# Altium schematic symbol library Diodes - TVS.SchLib: 5379 symbols (part 5 of 35) (continued)
## 824501511 (continued)
TVS DIODE 51V 82.4V DO214AC; Manufacturer: Würth Elektronik; Bidirectional Channels: 1; Current - Peak Pulse (10/1000µs): 4.9A; Power Line Protection: No; Power - Peak Pulse: 400W; Type: Zener; Voltage - Breakdown (Min): 59.7V (Typ); Voltage - Reverse Standoff (Typ): 51V (Max); Part Number: 824501511; Applications: General Purpose; ComponentLink1Description: Datasheet; ComponentLink1URL: https://katalog.we-online.de/pbs/datasheet/824501511.pdf; ComponentLink2Description: DigiKey Link; ComponentLink2URL: http://digikey.com/product-detail/en/w-rth-elektronik/824501511/732-9963-1-ND/5871116; LastUpdated: 9/2/2020 1:27:53 AM; Lifecycle Status: Active; Minimum Order: 1; Mounting Type: Surface Mount; Operating Temperature: -65°C ~ 150°C (TJ); Package / Case: DO-214AC, SMA; Packaging: TapeAndReel; PartId: 7630; Part Status: Active; Price: 0.17; Series: WE-TVSP; Supplier 1: DigiKey; Supplier Part Number 1: 732-9963-1-ND; Supplier Device Package: DO-214AC; Voltage - Clamping (Max) @ Ipp: 82.4V
footprint DO214AC SMA
pins: 1, 2

## 824501541
designator D?
TVS DIODE 54V 87.1V DO214AC; Manufacturer: Würth Elektronik; Bidirectional Channels: 1; Current - Peak Pulse (10/1000µs): 4.6A; Power Line Protection: No; Power - Peak Pulse: 400W; Type: Zener; Voltage - Breakdown (Min): 63.15V (Typ); Voltage - Reverse Standoff (Typ): 54V (Max); Part Number: 824501541; Applications: General Purpose; ComponentLink1Description: Datasheet; ComponentLink1URL: https://katalog.we-online.de/pbs/datasheet/824501541.pdf; ComponentLink2Description: DigiKey Link; ComponentLink2URL: http://digikey.com/product-detail/en/w-rth-elektronik/824501541/732-9964-1-ND/5871117; LastUpdated: 9/2/2020 1:27:53 AM; Lifecycle Status: Active; Minimum Order: 1; Mounting Type: Surface Mount; Operating Temperature: -65°C ~ 150°C (TJ); Package / Case: DO-214AC, SMA; Packaging: TapeAndReel; PartId: 7633; Part Status: Active; Price: 0.17; Series: WE-TVSP; Supplier 1: DigiKey; Supplier Part Number 1: 732-9964-1-ND; Supplier Device Package: DO-214AC; Voltage - Clamping (Max) @ Ipp: 87.1V
footprint DO214AC SMA
pins: 1, 2

## 824520101
designator D?
TVS DIODE 10V 17V DO214AA; Manufacturer: Würth Elektronik; Current - Peak Pulse (10/1000µs): 35.3A; Power Line Protection: No; Power - Peak Pulse: 600W; Type: Zener; Unidirectional Channels: 1; Voltage - Breakdown (Min): 11.7V (Typ); Voltage - Reverse Standoff (Typ): 10V (Max); Part Number: 824520101; Applications: General Purpose; ComponentLink1Description: Datasheet; ComponentLink1URL: https://katalog.we-online.de/pbs/datasheet/824520101.pdf; ComponentLink2Description: DigiKey Link; ComponentLink2URL: http://digikey.com/product-detail/en/w-rth-elektronik/824520101/732-9772-1-ND/5870926; LastUpdated: 9/2/2020 1:19:49 AM; Lifecycle Status: Active; Minimum Order: 0; Mounting Type: Surface Mount; Operating Temperature: -65°C ~ 150°C (TJ); Package / Case: DO-214AA, SMB; Packaging: TapeAndReel; PartId: 11157; Part Status: Active; Price: 0.24; Series: WE-TVSP; Supplier 1: DigiKey; Supplier Part Number 1: 732-9772-1-ND; Supplier Device Package: DO-214AA; Voltage - Clamping (Max) @ Ipp: 17V
footprint DO214AA SMB
pins: 1, 2

## 824520121
designator D?
TVS DIODE 12V 19.9V DO214AA; Manufacturer: Würth Elektronik; Current - Peak Pulse (10/1000µs): 30.2A; Power Line Protection: No; Power - Peak Pulse: 600W; Type: Zener; Unidirectional Channels: 1; Voltage - Breakdown (Min): 14V (Typ); Voltage - Reverse Standoff (Typ): 12V (Max); Part Number: 824520121; Applications: General Purpose; ComponentLink1Description: Datasheet; ComponentLink1URL: https://katalog.we-online.de/pbs/datasheet/824520121.pdf; ComponentLink2Description: DigiKey Link; ComponentLink2URL: http://digikey.com/product-detail/en/w-rth-elektronik/824520121/732-9774-1-ND/5870928; LastUpdated: 9/2/2020 1:19:51 AM; Lifecycle Status: Active; Minimum Order: 1; Mounting Type: Surface Mount; Operating Temperature: -65°C ~ 150°C (TJ); Package / Case: DO-214AA, SMB; Packaging: TapeAndReel; PartId: 11325; Part Status: Active; Price: 0.24; Series: WE-TVSP; Supplier 1: DigiKey; Supplier Part Number 1: 732-9774-1-ND; Supplier Device Package: DO-214AA; Voltage - Clamping (Max) @ Ipp: 19.9V
footprint DO214AA SMB
pins: 1, 2

## 824520301
designator D?
TVS DIODE 30V 48.4V DO214AA; Manufacturer: Würth Elektronik; Current - Peak Pulse (10/1000µs): 12.4A; Power Line Protection: No; Power - Peak Pulse: 600W; Type: Zener; Unidirectional Channels: 1; Voltage - Breakdown (Min): 35.05V (Typ); Voltage - Reverse Standoff (Typ): 30V (Max); Part Number: 824520301; Applications: General Purpose; ComponentLink1Description: Datasheet; ComponentLink1URL: https://katalog.we-online.de/pbs/datasheet/824520301.pdf; ComponentLink2Description: DigiKey Link; ComponentLink2URL: http://digikey.com/product-detail/en/w-rth-elektronik/824520301/732-9782-1-ND/5870936; LastUpdated: 9/2/2020 1:19:49 AM; Lifecycle Status: Active; Minimum Order: 1; Mounting Type: Surface Mount; Operating Temperature: -65°C ~ 150°C (TJ); Package / Case: DO-214AA, SMB; Packaging: TapeAndReel; PartId: 11151; Part Status: Active; Price: 0.24; Series: WE-TVSP; Supplier 1: DigiKey; Supplier Part Number 1: 732-9782-1-ND; Supplier Device Package: DO-214AA; Voltage - Clamping (Max) @ Ipp: 48.4V
footprint DO214AA SMB
pins: 1, 2

## 824520302
designator D?
WE-TVSP POWER TVS DIODE; Manufacturer: Würth Elektronik; Current - Peak Pulse (10/1000µs): 100A; Power Line Protection: No; Type: Zener; Unidirectional Channels: 1; Voltage - Breakdown (Min): 353V; Voltage - Clamping (Max) @ Ipp: 486V; Voltage - Reverse Standoff (Typ): 300V (Max); Part Number: 824520302; Applications: General Purpose; ComponentLink2Description: DigiKey Link; ComponentLink2URL: http://digikey.com/product-detail/en/würth-elektronik/824520302/732-824520302CT-ND/12728095; LastUpdated: 8/30/2020 9:00:52 PM; Lifecycle Status: Active; Minimum Order: 1; Mounting Type: Surface Mount; Operating Temperature: -65°C ~ 150°C (TA); Package / Case: DO-214AA, SMB; Packaging: TapeAndReel; PartId: 11468; Price: 0.54; Series: WE-TVSP; Supplier 1: DigiKey; Supplier Part Number 1: 732-824520302CT-ND; Supplier Device Package: DO-214AA
footprint DO214AA SMB
pins: 1, 2

## 824520331
designator D?
TVS DIODE 33V 53.3V DO214AA; Manufacturer: Würth Elektronik; Current - Peak Pulse (10/1000µs): 11.3A; Power Line Protection: No; Power - Peak Pulse: 600W; Type: Zener; Unidirectional Channels: 1; Voltage - Breakdown (Min): 38.65V (Typ); Voltage - Reverse Standoff (Typ): 33V (Max); Part Number: 824520331; Applications: General Purpose; ComponentLink1Description: Datasheet; ComponentLink1URL: https://katalog.we-online.de/pbs/datasheet/824520331.pdf; ComponentLink2Description: DigiKey Link; ComponentLink2URL: http://digikey.com/product-detail/en/w-rth-elektronik/824520331/732-9783-1-ND/5870937; LastUpdated: 9/2/2020 1:19:49 AM; Lifecycle Status: Active; Minimum Order: 1; Mounting Type: Surface Mount; Operating Temperature: -65°C ~ 150°C (TJ); Package / Case: DO-214AA, SMB; Packaging: TapeAndReel; PartId: 11149; Part Status: Active; Price: 0.24; Series: WE-TVSP; Supplier 1: DigiKey; Supplier Part Number 1: 732-9783-1-ND; Supplier Device Package: DO-214AA; Voltage - Clamping (Max) @ Ipp: 53.3V
footprint DO214AA SMB
pins: 1, 2

## 824520352
designator D?
WE-TVSP POWER TVS DIODE; Manufacturer: Würth Elektronik; Current - Peak Pulse (10/1000µs): 100A; Power Line Protection: No; Type: Zener; Unidirectional Channels: 1; Voltage - Breakdown (Min): 411.5V; Voltage - Clamping (Max) @ Ipp: 567V; Voltage - Reverse Standoff (Typ): 350V (Max); Part Number: 824520352; Applications: General Purpose; ComponentLink2Description: DigiKey Link; ComponentLink2URL: http://digikey.com/product-detail/en/würth-elektronik/824520352/732-824520352CT-ND/12727035; LastUpdated: 8/30/2020 9:00:52 PM; Lifecycle Status: Active; Minimum Order: 1; Mounting Type: Surface Mount; Operating Temperature: -65°C ~ 150°C (TA); Package / Case: DO-214AA, SMB; Packaging: TapeAndReel; PartId: 11469; Price: 0.47; Series: WE-TVSP; Supplier 1: DigiKey; Supplier Part Number 1: 732-824520352CT-ND; Supplier Device Package: DO-214AA
footprint DO214AA SMB
pins: 1, 2

## 824520500
designator D?
TVS DIODE 5V 9.2V DO214AA; Manufacturer: Würth Elektronik; Current - Peak Pulse (10/1000µs): 65.3A; Power Line Protection: No; Power - Peak Pulse: 600W; Type: Zener; Unidirectional Channels: 1; Voltage - Breakdown (Min): 6.7V (Typ); Voltage - Reverse Standoff (Typ): 5V (Max); Part Number: 824520500; Applications: General Purpose; ComponentLink1Description: Datasheet; ComponentLink1URL: https://katalog.we-online.de/pbs/datasheet/824520500.pdf; ComponentLink2Description: DigiKey Link; ComponentLink2URL: http://digikey.com/product-detail/en/w-rth-elektronik/824520500/732-9764-1-ND/5870918; LastUpdated: 9/2/2020 1:19:51 AM; Lifecycle Status: Active; Minimum Order: 1; Mounting Type: Surface Mount; Operating Temperature: -65°C ~ 150°C (TJ); Package / Case: DO-214AA, SMB; Packaging: TapeAndReel; PartId: 11326; Part Status: Active; Price: 0.24; Series: WE-TVSP; Supplier 1: DigiKey; Supplier Part Number 1: 732-9764-1-ND; Supplier Device Package: DO-214AA; Voltage - Clamping (Max) @ Ipp: 9.2V
footprint DO214AA SMB
pins: 1, 2

## 824520581
designator D?
TVS DIODE 58V 93.6V DO214AA; Manufacturer: Würth Elektronik; Current - Peak Pulse (10/1000µs): 6.5A; Power Line Protection: No; Power - Peak Pulse: 600W; Type: Zener; Unidirectional Channels: 1; Voltage - Breakdown (Min): 67.8V (Typ); Voltage - Reverse Standoff (Typ): 58V (Max); Part Number: 824520581; Applications: General Purpose; ComponentLink1Description: Datasheet; ComponentLink1URL: https://katalog.we-online.de/pbs/datasheet/824520581.pdf; ComponentLink2Description: DigiKey Link; ComponentLink2URL: http://digikey.com/product-detail/en/w-rth-elektronik/824520581/732-9790-1-ND/5870944; LastUpdated: 9/2/2020 1:19:49 AM; Lifecycle Status: Active; Minimum Order: 1; Mounting Type: Surface Mount; Operating Temperature: -65°C ~ 150°C (TJ); Package / Case: DO-214AA, SMB; Packaging: TapeAndReel; PartId: 11150; Part Status: Active; Price: 0.24; Series: WE-TVSP; Supplier 1: DigiKey; Supplier Part Number 1: 732-9790-1-ND; Supplier Device Package: DO-214AA; Voltage - Clamping (Max) @ Ipp: 93.6V
footprint DO214AA SMB
pins: 1, 2

## 824520700
designator D?
TVS DIODE 7V 12V DO214AA; Manufacturer: Würth Elektronik; Current - Peak Pulse (10/1000µs): 50A; Power Line Protection: No; Power - Peak Pulse: 600W; Type: Zener; Unidirectional Channels: 1; Voltage - Breakdown (Min): 8.19V (Typ); Voltage - Reverse Standoff (Typ): 7V (Max); Part Number: 824520700; Applications: General Purpose; ComponentLink1Description: Datasheet; ComponentLink1URL: https://katalog.we-online.de/pbs/datasheet/824520700.pdf; ComponentLink2Description: DigiKey Link; ComponentLink2URL: http://digikey.com/product-detail/en/w-rth-elektronik/824520700/732-9767-1-ND/5870921; LastUpdated: 9/2/2020 1:19:49 AM; Lifecycle Status: Active; Minimum Order: 1; Mounting Type: Surface Mount; Operating Temperature: -65°C ~ 150°C (TJ); Package / Case: DO-214AA, SMB; Packaging: TapeAndReel; PartId: 11158; Part Status: Active; Price: 0.24; Series: WE-TVSP; Supplier 1: DigiKey; Supplier Part Number 1: 732-9767-1-ND; Supplier Device Package: DO-214AA; Voltage - Clamping (Max) @ Ipp: 12V
footprint DO214AA SMB
pins: 1, 2

## 824521121
designator D?
TVS DIODE 12V 19.9V DO214AA; Manufacturer: Würth Elektronik; Bidirectional Channels: 1; Current - Peak Pulse (10/1000µs): 30.2A; Power Line Protection: No; Power - Peak Pulse: 600W; Type: Zener; Voltage - Breakdown (Min): 14V (Typ); Voltage - Reverse Standoff (Typ): 12V (Max); Part Number: 824521121; Applications: General Purpose; ComponentLink1Description: Datasheet; ComponentLink1URL: https://katalog.we-online.de/pbs/datasheet/824521121.pdf; ComponentLink2Description: DigiKey Link; ComponentLink2URL: http://digikey.com/product-detail/en/w-rth-elektronik/824521121/732-9739-1-ND/5870893; LastUpdated: 9/2/2020 1:28:20 AM; Lifecycle Status: Active; Minimum Order: 1; Mounting Type: Surface Mount; Operating Temperature: -65°C ~ 150°C (TJ); Package / Case: DO-214AA, SMB; Packaging: TapeAndReel; PartId: 9449; Part Status: Active; Price: 0.24; Series: WE-TVSP; Supplier 1: DigiKey; Supplier Part Number 1: 732-9739-1-ND; Supplier Device Package: DO-214AA; Voltage - Clamping (Max) @ Ipp: 19.9V
footprint DO214AA SMB
pins: 1, 2

## 824521131
designator D?
TVS DIODE 13V 21.5V DO214AA; Manufacturer: Würth Elektronik; Bidirectional Channels: 1; Current - Peak Pulse (10/1000µs): 28A; Power Line Protection: No; Power - Peak Pulse: 600W; Type: Zener; Voltage - Breakdown (Min): 15.15V (Typ); Voltage - Reverse Standoff (Typ): 13V (Max); Part Number: 824521131; Applications: General Purpose; ComponentLink1Description: Datasheet; ComponentLink1URL: https://katalog.we-online.de/pbs/datasheet/824521131.pdf; ComponentLink2Description: DigiKey Link; ComponentLink2URL: http://digikey.com/product-detail/en/w-rth-elektronik/824521131/732-9740-1-ND/5870894; LastUpdated: 9/2/2020 1:28:20 AM; Lifecycle Status: Active; Minimum Order: 1; Mounting Type: Surface Mount; Operating Temperature: -65°C ~ 150°C (TJ); Package / Case: DO-214AA, SMB; Packaging: TapeAndReel; PartId: 9447; Part Status: Active; Price: 0.24; Series: WE-TVSP; Supplier 1: DigiKey; Supplier Part Number 1: 732-9740-1-ND; Supplier Device Package: DO-214AA; Voltage - Clamping (Max) @ Ipp: 21.5V
footprint DO214AA SMB
pins: 1, 2

## 824521241
designator D?
TVS DIODE 24V 38.9V DO214AA; Manufacturer: Würth Elektronik; Bidirectional Channels: 1; Current - Peak Pulse (10/1000µs): 15.5A; Power Line Protection: No; Power - Peak Pulse: 600W; Type: Zener; Voltage - Breakdown (Min): 28.1V (Typ); Voltage - Reverse Standoff (Typ): 24V (Max); Part Number: 824521241; Applications: General Purpose; ComponentLink1Description: Datasheet; ComponentLink1URL: https://katalog.we-online.de/pbs/datasheet/824521241.pdf; ComponentLink2Description: DigiKey Link; ComponentLink2URL: http://digikey.com/product-detail/en/w-rth-elektronik/824521241/732-9746-1-ND/5870900; LastUpdated: 9/2/2020 1:28:20 AM; Lifecycle Status: Active; Minimum Order: 1; Mounting Type: Surface Mount; Operating Temperature: -65°C ~ 150°C (TJ); Package / Case: DO-214AA, SMB; Packaging: TapeAndReel; PartId: 9451; Part Status: Active; Price: 0.24; Series: WE-TVSP; Supplier 1: DigiKey; Supplier Part Number 1: 732-9746-1-ND; Supplier Device Package: DO-214AA; Voltage - Clamping (Max) @ Ipp: 38.9V
footprint DO214AA SMB
pins: 1, 2

## 824521261
designator D?
TVS DIODE 26V 42.1V DO214AA; Manufacturer: Würth Elektronik; Bidirectional Channels: 1; Current - Peak Pulse (10/1000µs): 14.3A; Power Line Protection: No; Power - Peak Pulse: 600W; Type: Zener; Voltage - Breakdown (Min): 30.4V (Typ); Voltage - Reverse Standoff (Typ): 26V (Max); Part Number: 824521261; Applications: General Purpose; ComponentLink1Description: Datasheet; ComponentLink1URL: https://katalog.we-online.de/pbs/datasheet/824521261.pdf; ComponentLink2Description: DigiKey Link; ComponentLink2URL: http://digikey.com/product-detail/en/w-rth-elektronik/824521261/732-9742-1-ND/5870896; LastUpdated: 9/2/2020 1:28:20 AM; Lifecycle Status: Active; Minimum Order: 1; Mounting Type: Surface Mount; Operating Temperature: -65°C ~ 150°C (TJ); Package / Case: DO-214AA, SMB; Packaging: TapeAndReel; PartId: 9450; Part Status: Active; Price: 0.24; Series: WE-TVSP; Supplier 1: DigiKey; Supplier Part Number 1: 732-9742-1-ND; Supplier Device Package: DO-214AA; Voltage - Clamping (Max) @ Ipp: 42.1V
footprint DO214AA SMB
pins: 1, 2

## 824521301
designator D?
TVS DIODE 30V 48.4V DO214AA; Manufacturer: Würth Elektronik; Bidirectional Channels: 1; Current - Peak Pulse (10/1000µs): 12.4A; Power Line Protection: No; Power - Peak Pulse: 600W; Type: Zener; Voltage - Breakdown (Min): 35.05V (Typ); Voltage - Reverse Standoff (Typ): 30V (Max); Part Number: 824521301; Applications: General Purpose; ComponentLink1Description: Datasheet; ComponentLink1URL: https://katalog.we-online.de/pbs/datasheet/824521301.pdf; ComponentLink2Description: DigiKey Link; ComponentLink2URL: http://digikey.com/product-detail/en/w-rth-elektronik/824521301/732-9747-1-ND/5870901; LastUpdated: 9/2/2020 1:28:16 AM; Lifecycle Status: Active; Minimum Order: 1; Mounting Type: Surface Mount; Operating Temperature: -65°C ~ 150°C (TJ); Package / Case: DO-214AA, SMB; Packaging: TapeAndReel; PartId: 8966; Part Status: Active; Price: 0.24; Series: WE-TVSP; Supplier 1: DigiKey; Supplier Part Number 1: 732-9747-1-ND; Supplier Device Package: DO-214AA; Voltage - Clamping (Max) @ Ipp: 48.4V
footprint DO214AA SMB
pins: 1, 2

## 824521302
designator D?
WE-TVSP POWER TVS DIODE; Manufacturer: Würth Elektronik; Bidirectional Channels: 1; Current - Peak Pulse (10/1000µs): 1.3A; Power Line Protection: No; Type: Zener; Voltage - Breakdown (Min): 353V; Voltage - Clamping (Max) @ Ipp: 486V; Voltage - Reverse Standoff (Typ): 300V (Max); Part Number: 824521302; Applications: General Purpose; ComponentLink2Description: DigiKey Link; ComponentLink2URL: http://digikey.com/product-detail/en/würth-elektronik/824521302/732-824521302CT-ND/12728091; LastUpdated: 8/30/2020 9:07:43 PM; Lifecycle Status: Active; Minimum Order: 1; Mounting Type: Surface Mount; Operating Temperature: -65°C ~ 150°C (TA); Package / Case: DO-214AA, SMB; Packaging: TapeAndReel; PartId: 11485; Price: 0.46; Series: WE-TVSP; Supplier 1: DigiKey; Supplier Part Number 1: 732-824521302CT-ND; Supplier Device Package: DO-214AA
footprint DO214AA SMB
pins: 1, 2

## 824521331
designator D?
TVS DIODE 33V 53.3V DO214AA; Manufacturer: Würth Elektronik; Bidirectional Channels: 1; Current - Peak Pulse (10/1000µs): 11.3A; Power Line Protection: No; Power - Peak Pulse: 600W; Type: Zener; Voltage - Breakdown (Min): 38.65V (Typ); Voltage - Reverse Standoff (Typ): 33V (Max); Part Number: 824521331; Applications: General Purpose; ComponentLink1Description: Datasheet; ComponentLink1URL: https://katalog.we-online.de/pbs/datasheet/824521331.pdf; ComponentLink2Description: DigiKey Link; ComponentLink2URL: http://digikey.com/product-detail/en/w-rth-elektronik/824521331/732-9748-1-ND/5870902; LastUpdated: 9/2/2020 1:28:20 AM; Lifecycle Status: Active; Minimum Order: 0; Mounting Type: Surface Mount; Operating Temperature: -65°C ~ 150°C (TJ); Package / Case: DO-214AA, SMB; Packaging: TapeAndReel; PartId: 9457; Part Status: Active; Price: 0.24; Series: WE-TVSP; Supplier 1: DigiKey; Supplier Part Number 1: 732-9748-1-ND; Supplier Device Package: DO-214AA; Voltage - Clamping (Max) @ Ipp: 53.3V
footprint DO214AA SMB
pins: 1, 2

## 824521361
designator D?
TVS DIODE 36V 58.1V DO214AA; Manufacturer: Würth Elektronik; Bidirectional Channels: 1; Current - Peak Pulse (10/1000µs): 10.4A; Power Line Protection: No; Power - Peak Pulse: 600W; Type: Zener; Voltage - Breakdown (Min): 42.1V (Typ); Voltage - Reverse Standoff (Typ): 36V (Max); Part Number: 824521361; Applications: General Purpose; ComponentLink1Description: Datasheet; ComponentLink1URL: https://katalog.we-online.de/pbs/datasheet/824521361.pdf; ComponentLink2Description: DigiKey Link; ComponentLink2URL: http://digikey.com/product-detail/en/w-rth-elektronik/824521361/732-9749-1-ND/5870903; LastUpdated: 9/2/2020 1:28:20 AM; Lifecycle Status: Active; Minimum Order: 0; Mounting Type: Surface Mount; Operating Temperature: -65°C ~ 150°C (TJ); Package / Case: DO-214AA, SMB; Packaging: TapeAndReel; PartId: 9454; Part Status: Active; Price: 0.24; Series: WE-TVSP; Supplier 1: DigiKey; Supplier Part Number 1: 732-9749-1-ND; Supplier Device Package: DO-214AA; Voltage - Clamping (Max) @ Ipp: 58.1V
footprint DO214AA SMB
pins: 1, 2

## 824521500
designator D?
TVS DIODE 5V 9.2V DO214AA; Manufacturer: Würth Elektronik; Bidirectional Channels: 1; Current - Peak Pulse (10/1000µs): 65.3A; Power Line Protection: No; Power - Peak Pulse: 600W; Type: Zener; Voltage - Breakdown (Min): 6.7V (Typ); Voltage - Reverse Standoff (Typ): 5V (Max); Part Number: 824521500; Applications: General Purpose; ComponentLink1Description: Datasheet; ComponentLink1URL: https://katalog.we-online.de/pbs/datasheet/824521500.pdf; ComponentLink2Description: DigiKey Link; ComponentLink2URL: http://digikey.com/product-detail/en/w-rth-elektronik/824521500/732-9729-1-ND/5870883; LastUpdated: 9/2/2020 1:28:20 AM; Lifecycle Status: Active; Minimum Order: 1; Mounting Type: Surface Mount; Operating Temperature: -65°C ~ 150°C (TJ); Package / Case: DO-214AA, SMB; Packaging: TapeAndReel; PartId: 9462; Part Status: Active; Price: 0.24; Series: WE-TVSP; Supplier 1: DigiKey; Supplier Part Number 1: 732-9729-1-ND; Supplier Device Package: DO-214AA; Voltage - Clamping (Max) @ Ipp: 9.2V
footprint DO214AA SMB
pins: 1, 2

## 824521511
designator D?
TVS DIODE 51V 82.4V DO214AA; Manufacturer: Würth Elektronik; Bidirectional Channels: 1; Current - Peak Pulse (10/1000µs): 7.3A; Power Line Protection: No; Power - Peak Pulse: 600W; Type: Zener; Voltage - Breakdown (Min): 59.7V (Typ); Voltage - Reverse Standoff (Typ): 51V (Max); Part Number: 824521511; Applications: General Purpose; ComponentLink1Description: Datasheet; ComponentLink1URL: https://katalog.we-online.de/pbs/datasheet/824521511.pdf; ComponentLink2Description: DigiKey Link; ComponentLink2URL: http://digikey.com/product-detail/en/w-rth-elektronik/824521511/732-9754-1-ND/5870908; LastUpdated: 9/2/2020 1:28:20 AM; Lifecycle Status: Active; Minimum Order: 1; Mounting Type: Surface Mount; Operating Temperature: -65°C ~ 150°C (TJ); Package / Case: DO-214AA, SMB; Packaging: TapeAndReel; PartId: 9448; Part Status: Active; Price: 0.24; Series: WE-TVSP; Supplier 1: DigiKey; Supplier Part Number 1: 732-9754-1-ND; Supplier Device Package: DO-214AA; Voltage - Clamping (Max) @ Ipp: 82.4V
footprint DO214AA SMB
pins: 1, 2

## 824521541
designator D?
TVS DIODE 54V 87.1V DO214AA; Manufacturer: Würth Elektronik; Bidirectional Channels: 1; Current - Peak Pulse (10/1000µs): 6.9A; Power Line Protection: No; Power - Peak Pulse: 600W; Type: Zener; Voltage - Breakdown (Min): 63.15V (Typ); Voltage - Reverse Standoff (Typ): 54V (Max); Part Number: 824521541; Applications: General Purpose; ComponentLink1Description: Datasheet; ComponentLink1URL: https://katalog.we-online.de/pbs/datasheet/824521541.pdf; ComponentLink2Description: DigiKey Link; ComponentLink2URL: http://digikey.com/product-detail/en/w-rth-elektronik/824521541/732-9755-1-ND/5870909; LastUpdated: 9/2/2020 1:28:15 AM; Lifecycle Status: Active; Minimum Order: 0; Mounting Type: Surface Mount; Operating Temperature: -65°C ~ 150°C (TJ); Package / Case: DO-214AA, SMB; Packaging: TapeAndReel; PartId: 8816; Part Status: Active; Price: 0.24; Series: WE-TVSP; Supplier 1: DigiKey; Supplier Part Number 1: 732-9755-1-ND; Supplier Device Package: DO-214AA; Voltage - Clamping (Max) @ Ipp: 87.1V
footprint DO214AA SMB
pins: 1, 2

## 824521581
designator D?
TVS DIODE 58V 93.6V DO214AA; Manufacturer: Würth Elektronik; Bidirectional Channels: 1; Current - Peak Pulse (10/1000µs): 6.5A; Power Line Protection: No; Power - Peak Pulse: 600W; Type: Zener; Voltage - Breakdown (Min): 67.8V (Typ); Voltage - Reverse Standoff (Typ): 58V (Max); Part Number: 824521581; Applications: General Purpose; ComponentLink1Description: Datasheet; ComponentLink1URL: https://katalog.we-online.de/pbs/datasheet/824521581.pdf; ComponentLink2Description: DigiKey Link; ComponentLink2URL: http://digikey.com/product-detail/en/w-rth-elektronik/824521581/732-9753-1-ND/5870907; LastUpdated: 9/2/2020 1:28:20 AM; Lifecycle Status: Active; Minimum Order: 0; Mounting Type: Surface Mount; Operating Temperature: -65°C ~ 150°C (TJ); Package / Case: DO-214AA, SMB; Packaging: TapeAndReel; PartId: 9452; Part Status: Active; Price: 0.24; Series: WE-TVSP; Supplier 1: DigiKey; Supplier Part Number 1: 732-9753-1-ND; Supplier Device Package: DO-214AA; Voltage - Clamping (Max) @ Ipp: 93.6V
footprint DO214AA SMB
pins: 1, 2

## 824521600
designator D?
TVS DIODE 6V 10.3V DO214AA; Manufacturer: Würth Elektronik; Bidirectional Channels: 1; Current - Peak Pulse (10/1000µs): 58.3A; Power Line Protection: No; Power - Peak Pulse: 600W; Type: Zener; Voltage - Breakdown (Min): 7.02V (Typ); Voltage - Reverse Standoff (Typ): 6V (Max); Part Number: 824521600; Applications: General Purpose; ComponentLink1Description: Datasheet; ComponentLink1URL: https://katalog.we-online.de/pbs/datasheet/824521600.pdf; ComponentLink2Description: DigiKey Link; ComponentLink2URL: http://digikey.com/product-detail/en/w-rth-elektronik/824521600/732-9730-1-ND/5870884; LastUpdated: 9/2/2020 1:28:20 AM; Lifecycle Status: Active; Minimum Order: 0; Mounting Type: Surface Mount; Operating Temperature: -65°C ~ 150°C (TJ); Package / Case: DO-214AA, SMB; Packaging: TapeAndReel; PartId: 9461; Part Status: Active; Price: 0.24; Series: WE-TVSP; Supplier 1: DigiKey; Supplier Part Number 1: 732-9730-1-ND; Supplier Device Package: DO-214AA; Voltage - Clamping (Max) @ Ipp: 10.3V
footprint DO214AA SMB
pins: 1, 2

## 824521750
designator D?
TVS DIODE 7.5V 12.9V DO214AA; Manufacturer: Würth Elektronik; Bidirectional Channels: 1; Current - Peak Pulse (10/1000µs): 46.6A; Power Line Protection: No; Power - Peak Pulse: 600W; Type: Zener; Voltage - Breakdown (Min): 8.77V (Typ); Voltage - Reverse Standoff (Typ): 7.5V (Max); Part Number: 824521750; Applications: General Purpose; ComponentLink1Description: Datasheet; ComponentLink1URL: https://katalog.we-online.de/pbs/datasheet/824521750.pdf; ComponentLink2Description: DigiKey Link; ComponentLink2URL: http://digikey.com/product-detail/en/w-rth-elektronik/824521750/732-9733-1-ND/5870887; LastUpdated: 9/2/2020 1:28:20 AM; Lifecycle Status: Active; Minimum Order: 1; Mounting Type: Surface Mount; Operating Temperature: -65°C ~ 150°C (TJ); Package / Case: DO-214AA, SMB; Packaging: TapeAndReel; PartId: 9460; Part Status: Active; Price: 0.24; Series: WE-TVSP; Supplier 1: DigiKey; Supplier Part Number 1: 732-9733-1-ND; Supplier Device Package: DO-214AA; Voltage - Clamping (Max) @ Ipp: 12.9V
footprint DO214AA SMB
pins: 1, 2

## 824521751
designator D?
TVS DIODE 75V 121V DO214AA; Manufacturer: Würth Elektronik; Bidirectional Channels: 1; Current - Peak Pulse (10/1000µs): 5A; Power Line Protection: No; Power - Peak Pulse: 600W; Type: Zener; Voltage - Breakdown (Min): 87.7V (Typ); Voltage - Reverse Standoff (Typ): 75V (Max); Part Number: 824521751; Applications: General Purpose; ComponentLink1Description: Datasheet; ComponentLink1URL: https://katalog.we-online.de/pbs/datasheet/824521751.pdf; ComponentLink2Description: DigiKey Link; ComponentLink2URL: http://digikey.com/product-detail/en/w-rth-elektronik/824521751/732-9759-1-ND/5870913; LastUpdated: 9/2/2020 1:28:20 AM; Lifecycle Status: Active; Minimum Order: 0; Mounting Type: Surface Mount; Operating Temperature: -65°C ~ 150°C (TJ); Package / Case: DO-214AA, SMB; Packaging: TapeAndReel; PartId: 9453; Part Status: Active; Price: 0.24; Series: WE-TVSP; Supplier 1: DigiKey; Supplier Part Number 1: 732-9759-1-ND; Supplier Device Package: DO-214AA; Voltage - Clamping (Max) @ Ipp: 121V
footprint DO214AA SMB
pins: 1, 2

## 824540222
designator D?
WE-TVSP POWER TVS DIODE; Manufacturer: Würth Elektronik; Current - Peak Pulse (10/1000µs): 200A; Power Line Protection: No; Type: Zener; Unidirectional Channels: 1; Voltage - Breakdown (Min): 259V; Voltage - Clamping (Max) @ Ipp: 356V; Voltage - Reverse Standoff (Typ): 220V (Max); Part Number: 824540222; Applications: General Purpose; ComponentLink2Description: DigiKey Link; ComponentLink2URL: http://digikey.com/product-detail/en/würth-elektronik/824540222/732-824540222CT-ND/12726950; LastUpdated: 8/30/2020 9:01:03 PM; Lifecycle Status: Active; Minimum Order: 1; Mounting Type: Surface Mount; Operating Temperature: -65°C ~ 150°C (TA); Package / Case: DO-214AB, SMC; Packaging: TapeAndReel; PartId: 11471; Price: 0.66; Series: WE-TVSP; Supplier 1: DigiKey; Supplier Part Number 1: 732-824540222CT-ND; Supplier Device Package: DO-214AB
footprint DO214AB SMC
pins: 1, 2

## 824540241
designator D?
TVS DIODE 24V 38.9V DO214AB; Manufacturer: Würth Elektronik; Current - Peak Pulse (10/1000µs): 38.6A; Power Line Protection: No; Power - Peak Pulse: 1500W (1.5kW); Type: Zener; Unidirectional Channels: 1; Voltage - Breakdown (Min): 28.1V (Typ); Voltage - Reverse Standoff (Typ): 24V (Max); Part Number: 824540241; Applications: General Purpose; ComponentLink1Description: Datasheet; ComponentLink1URL: https://katalog.we-online.de/pbs/datasheet/824540241.pdf; ComponentLink2Description: DigiKey Link; ComponentLink2URL: http://digikey.com/product-detail/en/w-rth-elektronik/824540241/732-9851-1-ND/5871005; LastUpdated: 9/2/2020 1:20:03 AM; Lifecycle Status: Active; Minimum Order: 1; Mounting Type: Surface Mount; Operating Temperature: -65°C ~ 150°C (TJ); Package / Case: DO-214AB, SMC; Packaging: TapeAndReel; PartId: 6668; Part Status: Active; Price: 0.60; Series: WE-TVSP; Supplier 1: DigiKey; Supplier Part Number 1: 732-9851-1-ND; Supplier Device Package: DO-214AB; Voltage - Clamping (Max) @ Ipp: 38.9V
footprint DO214AB SMC
pins: 1, 2

## 824540281
designator D?
TVS DIODE 28V 45.4V DO214AB; Manufacturer: Würth Elektronik; Current - Peak Pulse (10/1000µs): 33.1A; Power Line Protection: No; Power - Peak Pulse: 1500W (1.5kW); Type: Zener; Unidirectional Channels: 1; Voltage - Breakdown (Min): 32.75V (Typ); Voltage - Reverse Standoff (Typ): 28V (Max); Part Number: 824540281; Applications: General Purpose; ComponentLink1Description: Datasheet; ComponentLink1URL: https://katalog.we-online.de/pbs/datasheet/824540281.pdf; ComponentLink2Description: DigiKey Link; ComponentLink2URL: http://digikey.com/product-detail/en/w-rth-elektronik/824540281/732-9848-1-ND/5871002; LastUpdated: 9/2/2020 1:20:00 AM; Lifecycle Status: Active; Minimum Order: 1; Mounting Type: Surface Mount; Operating Temperature: -65°C ~ 150°C (TJ); Package / Case: DO-214AB, SMC; Packaging: TapeAndReel; PartId: 6434; Part Status: Active; Price: 0.60; Series: WE-TVSP; Supplier 1: DigiKey; Supplier Part Number 1: 732-9848-1-ND; Supplier Device Package: DO-214AB; Voltage - Clamping (Max) @ Ipp: 45.4V
footprint DO214AB SMC
pins: 1, 2

## 824540331
designator D?
TVS DIODE 33V 53.3V DO214AB; Manufacturer: Würth Elektronik; Current - Peak Pulse (10/1000µs): 28.2A; Power Line Protection: No; Power - Peak Pulse: 1500W (1.5kW); Type: Zener; Unidirectional Channels: 1; Voltage - Breakdown (Min): 38.65V (Typ); Voltage - Reverse Standoff (Typ): 33V (Max); Part Number: 824540331; Applications: General Purpose; ComponentLink1Description: Datasheet; ComponentLink1URL: https://katalog.we-online.de/pbs/datasheet/824540331.pdf; ComponentLink2Description: DigiKey Link; ComponentLink2URL: http://digikey.com/product-detail/en/w-rth-elektronik/824540331/732-9853-1-ND/5871007; LastUpdated: 9/2/2020 1:20:03 AM; Lifecycle Status: Active; Minimum Order: 0; Mounting Type: Surface Mount; Operating Temperature: -65°C ~ 150°C (TJ); Package / Case: DO-214AB, SMC; Packaging: TapeAndReel; PartId: 6669; Part Status: Active; Price: 0.60; Series: WE-TVSP; Supplier 1: DigiKey; Supplier Part Number 1: 732-9853-1-ND; Supplier Device Package: DO-214AB; Voltage - Clamping (Max) @ Ipp: 53.3V
footprint DO214AB SMC
pins: 1, 2

## 824540402
designator D?
WE-TVSP POWER TVS DIODE; Manufacturer: Würth Elektronik; Current - Peak Pulse (10/1000µs): 200A; Power Line Protection: No; Type: Zener; Unidirectional Channels: 1; Voltage - Breakdown (Min): 470.5V; Voltage - Clamping (Max) @ Ipp: 648V; Voltage - Reverse Standoff (Typ): 400V (Max); Part Number: 824540402; Applications: General Purpose; ComponentLink2Description: DigiKey Link; ComponentLink2URL: http://digikey.com/product-detail/en/würth-elektronik/824540402/732-824540402CT-ND/12727062; LastUpdated: 8/30/2020 9:01:03 PM; Lifecycle Status: Active; Minimum Order: 1; Mounting Type: Surface Mount; Package / Case: DO-214AB, SMC; Packaging: CutTape; PartId: 11472; Price: 1.67; Series: WE-TVSP; Supplier 1: DigiKey; Supplier Part Number 1: 732-824540402CT-ND; Supplier Device Package: DO-214AB
footprint DO214AB SMC
pins: 1, 2

## 824540442
designator D?
WE-TVSP POWER TVS DIODE; Manufacturer: Würth Elektronik; Current - Peak Pulse (10/1000µs): 200A; Power Line Protection: No; Type: Zener; Unidirectional Channels: 1; Voltage - Breakdown (Min): 517.5V; Voltage - Clamping (Max) @ Ipp: 713V; Voltage - Reverse Standoff (Typ): 440V (Max); Part Number: 824540442; Applications: General Purpose; ComponentLink2Description: DigiKey Link; ComponentLink2URL: http://digikey.com/product-detail/en/würth-elektronik/824540442/732-824540442CT-ND/12727109; LastUpdated: 8/30/2020 9:01:03 PM; Lifecycle Status: Active; Minimum Order: 1; Mounting Type: Surface Mount; Package / Case: DO-214AB, SMC; Packaging: CutTape; PartId: 11470; Price: 1.67; Series: WE-TVSP; Supplier 1: DigiKey; Supplier Part Number 1: 732-824540442CT-ND; Supplier Device Package: DO-214AB
footprint DO214AB SMC
pins: 1, 2

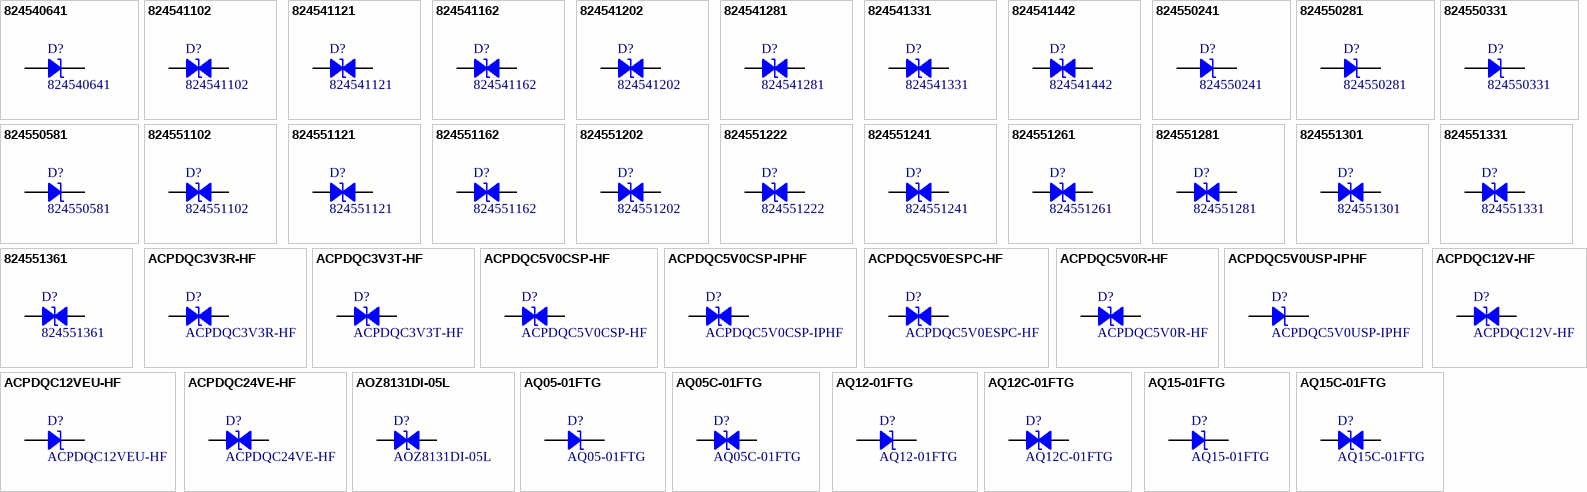
[diagram p17: symbols 824540641 to AQ15C-01FTG]

## 824540641
designator D?
TVS DIODE 64V 103V DO214AB; Manufacturer: Würth Elektronik; Current - Peak Pulse (10/1000µs): 14.6A; Power Line Protection: No; Power - Peak Pulse: 1500W (1.5kW); Type: Zener; Unidirectional Channels: 1; Voltage - Breakdown (Min): 74.85V (Typ); Voltage - Reverse Standoff (Typ): 64V (Max); Part Number: 824540641; Applications: General Purpose; ComponentLink1Description: Datasheet; ComponentLink1URL: https://katalog.we-online.de/pbs/datasheet/824540641.pdf; ComponentLink2Description: DigiKey Link; ComponentLink2URL: http://digikey.com/product-detail/en/w-rth-elektronik/824540641/732-9862-1-ND/5871016; LastUpdated: 9/2/2020 1:20:00 AM; Lifecycle Status: Active; Minimum Order: 0; Mounting Type: Surface Mount; Operating Temperature: -65°C ~ 150°C (TJ); Package / Case: DO-214AB, SMC; Packaging: TapeAndReel; PartId: 6433; Part Status: Active; Price: 0.60; Series: WE-TVSP; Supplier 1: DigiKey; Supplier Part Number 1: 732-9862-1-ND; Supplier Device Package: DO-214AB; Voltage - Clamping (Max) @ Ipp: 103V
footprint DO214AB SMC
pins: 1, 2

## 824541102
designator D?
TVS DIODE 100V 162V DO214AB; Manufacturer: Würth Elektronik; Bidirectional Channels: 1; Current - Peak Pulse (10/1000µs): 9.3A; Power Line Protection: No; Power - Peak Pulse: 1500W (1.5kW); Type: Zener; Voltage - Breakdown (Min): 117V (Typ); Voltage - Reverse Standoff (Typ): 100V (Max); Part Number: 824541102; Applications: General Purpose; ComponentLink1Description: Datasheet; ComponentLink1URL: https://katalog.we-online.de/pbs/datasheet/824541102.pdf; ComponentLink2Description: DigiKey Link; ComponentLink2URL: http://digikey.com/product-detail/en/w-rth-elektronik/824541102/732-9833-1-ND/5870987; LastUpdated: 9/2/2020 1:28:05 AM; Lifecycle Status: Active; Minimum Order: 1; Mounting Type: Surface Mount; Operating Temperature: -65°C ~ 150°C (TJ); Package / Case: DO-214AB, SMC; Packaging: TapeAndReel; PartId: 8277; Part Status: Active; Price: 0.60; Series: WE-TVSP; Supplier 1: DigiKey; Supplier Part Number 1: 732-9833-1-ND; Supplier Device Package: DO-214AB; Voltage - Clamping (Max) @ Ipp: 162V
footprint DO214AB SMC
pins: 1, 2

## 824541121
designator D?
TVS DIODE 12V 19.9V DO214AB; Manufacturer: Würth Elektronik; Bidirectional Channels: 1; Current - Peak Pulse (10/1000µs): 75.4A; Power Line Protection: No; Power - Peak Pulse: 1500W (1.5kW); Type: Zener; Voltage - Breakdown (Min): 14V (Typ); Voltage - Reverse Standoff (Typ): 12V (Max); Part Number: 824541121; Applications: General Purpose; ComponentLink1Description: Datasheet; ComponentLink1URL: https://katalog.we-online.de/pbs/datasheet/824541121.pdf; ComponentLink2Description: DigiKey Link; ComponentLink2URL: http://digikey.com/product-detail/en/w-rth-elektronik/824541121/732-9809-1-ND/5870963; LastUpdated: 9/2/2020 1:28:06 AM; Lifecycle Status: Active; Minimum Order: 0; Mounting Type: Surface Mount; Operating Temperature: -65°C ~ 150°C (TJ); Package / Case: DO-214AB, SMC; Packaging: TapeAndReel; PartId: 8489; Part Status: Active; Price: 0.60; Series: WE-TVSP; Supplier 1: DigiKey; Supplier Part Number 1: 732-9809-1-ND; Supplier Device Package: DO-214AB; Voltage - Clamping (Max) @ Ipp: 19.9V
footprint DO214AB SMC
pins: 1, 2

## 824541162
designator D?
WE-TVSP POWER TVS DIODE; Manufacturer: Würth Elektronik; Bidirectional Channels: 1; Current - Peak Pulse (10/1000µs): 5.8A; Power Line Protection: No; Type: Zener; Voltage - Breakdown (Min): 187.5V; Voltage - Clamping (Max) @ Ipp: 259V; Voltage - Reverse Standoff (Typ): 160V (Max); Part Number: 824541162; Applications: General Purpose; ComponentLink2Description: DigiKey Link; ComponentLink2URL: http://digikey.com/product-detail/en/würth-elektronik/824541162/732-824541162CT-ND/12727066; LastUpdated: 8/30/2020 9:07:32 PM; Lifecycle Status: Active; Minimum Order: 1; Mounting Type: Surface Mount; Operating Temperature: -65°C ~ 150°C (TA); Package / Case: DO-214AB, SMC; Packaging: TapeAndReel; PartId: 11478; Price: 0.66; Series: WE-TVSP; Supplier 1: DigiKey; Supplier Part Number 1: 732-824541162CT-ND; Supplier Device Package: DO-214AB
footprint DO214AB SMC
pins: 1, 2

## 824541202
designator D?
WE-TVSP POWER TVS DIODE; Manufacturer: Würth Elektronik; Bidirectional Channels: 1; Current - Peak Pulse (10/1000µs): 4.6A; Power Line Protection: No; Type: Zener; Voltage - Breakdown (Min): 235.5V; Voltage - Clamping (Max) @ Ipp: 324V; Voltage - Reverse Standoff (Typ): 200V (Max); Part Number: 824541202; Applications: General Purpose; ComponentLink2Description: DigiKey Link; ComponentLink2URL: http://digikey.com/product-detail/en/würth-elektronik/824541202/732-824541202CT-ND/12727779; LastUpdated: 8/30/2020 9:07:32 PM; Lifecycle Status: Active; Minimum Order: 1; Mounting Type: Surface Mount; Operating Temperature: -65°C ~ 150°C (TA); Package / Case: DO-214AB, SMC; Packaging: TapeAndReel; PartId: 11477; Price: 0.73; Series: WE-TVSP; Supplier 1: DigiKey; Supplier Part Number 1: 732-824541202CT-ND; Supplier Device Package: DO-214AB
footprint DO214AB SMC
pins: 1, 2

## 824541281
designator D?
TVS DIODE 28V 45.4V DO214AB; Manufacturer: Würth Elektronik; Bidirectional Channels: 1; Current - Peak Pulse (10/1000µs): 33.1A; Power Line Protection: No; Power - Peak Pulse: 1500W (1.5kW); Type: Zener; Voltage - Breakdown (Min): 32.75V (Typ); Voltage - Reverse Standoff (Typ): 28V (Max); Part Number: 824541281; Applications: General Purpose; ComponentLink1Description: Datasheet; ComponentLink1URL: https://katalog.we-online.de/pbs/datasheet/824541281.pdf; ComponentLink2Description: DigiKey Link; ComponentLink2URL: http://digikey.com/product-detail/en/w-rth-elektronik/824541281/732-9813-1-ND/5870967; LastUpdated: 9/2/2020 1:28:05 AM; Lifecycle Status: Active; Minimum Order: 1; Mounting Type: Surface Mount; Operating Temperature: -65°C ~ 150°C (TJ); Package / Case: DO-214AB, SMC; Packaging: TapeAndReel; PartId: 8276; Part Status: Active; Price: 0.60; Series: WE-TVSP; Supplier 1: DigiKey; Supplier Part Number 1: 732-9813-1-ND; Supplier Device Package: DO-214AB; Voltage - Clamping (Max) @ Ipp: 45.4V
footprint DO214AB SMC
pins: 1, 2

## 824541331
designator D?